# Altium footprint library PASSIVE_THD.PCBLIB: 84 footprints (part 1 of 6)
Each footprint in its own frame and in the unit in brackets; x right, y up, seen from the top. Pads: shape width x height; smd on the part's side, far side on the other; paste and mask are expansions set on the pad; w line width, h text height; cw(c..) or ccw(c..) is an arc to the next point about the centre after c.
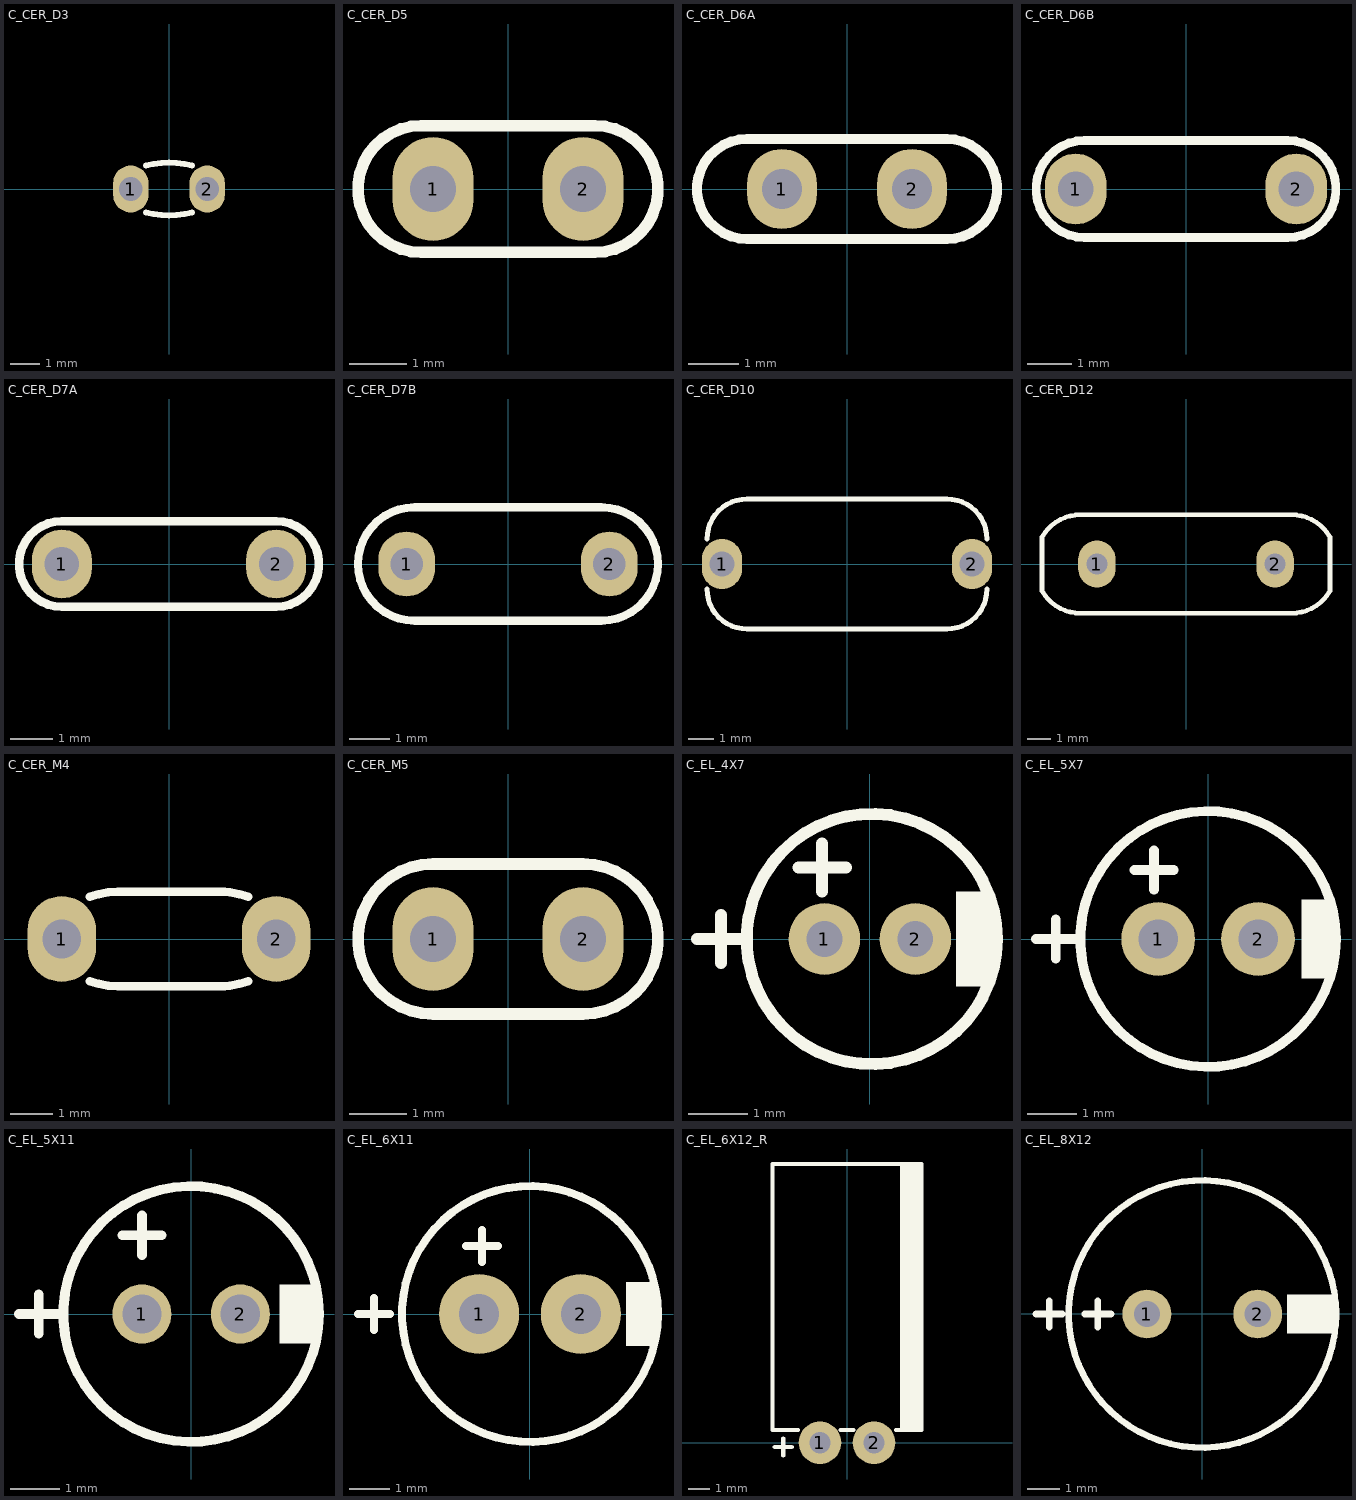
[diagram p0: the footprints below, top view; thin cyan lines are the x and y axes]

## C_CER_D3 [mm] "CAP, CER MULTILAYER, D:3.5mm, pitch: 2.54mm"
height 5.5
pads (2):
  oval 1.2x1.6 hole 0.8: 1(-1.3,0) 2(1.3,0)
TopOverlay:
  lines w0.2: -0.776,-0.798 ccw(c0,2.1) 0.776,-0.798 ; -0.776,0.798 cw(c0,-2.1) 0.776,0.798
3D body "User Library-Cer-Cap2 (3_5x1_5).step": height 4, standoff -2.5, extent -1.75,-0.75 1.75,0.751

## C_CER_D5 [mm] "CAP, CER, D:5mm, pitch: 2.5mm"
height 6.5
pads (2):
  oval 1.4x1.8 hole 0.8: 1(-1.3,0) 2(1.3,0)
TopOverlay:
  lines w0.2: -1.5,-1.1 cw(c-1.5,0) -1.5,1.1 1.5,1.1 cw(c1.5,0) 1.5,-1.1 -1.5,-1.1
3D body "Ceramic Capacitor 5x3_75mm.step": height 5.45, standoff -3.5, extent -2.458,-1 2.459,1

## C_CER_D6A [mm] "CAP, CER MULTILAYER, 5.8X1.7mm, pitch: 2.5mm"
height 6.5
pads (2):
  oval 1.4x1.6 hole 0.8 mask+0.075: 1(-1.3,0) 2(1.3,0)
TopOverlay:
  lines w0.2: -2,-1 cw(c-2,0) -2,1 2,1 cw(c2,0) 2,-1 -2,-1
3D body "Cap 100n.STEP": height 6.92, standoff -1, extent -2.918,-0.848 2.921,0.848

## C_CER_D6B [mm] "CAP, CER MULTILAYER, 6X2mm, pitch: 5mm"
height 6.5
pads (2):
  oval 1.4x1.6 hole 0.8 mask+0.075: 1(-2.5,0) 2(2.5,0)
TopOverlay:
  lines w0.2: -2.3,-1.1 cw(c-2.3,0) -2.3,1.1 2.3,1.1 cw(c2.3,0) 2.3,-1.1 -2.3,-1.1
3D body "User Library-Disc_CAP d6x3_5_5mm.step": height 8.1, standoff -2.02, extent -3,-1.05 3,1.05

## C_CER_D7A [mm] "CAP, CER MULTILAYER, 7.0X1.7mm, pitch: 5.0mm"
height 6.5
pads (2):
  oval 1.4x1.6 hole 0.8 mask+0.075: 1(-2.5,0) 2(2.5,0)
TopOverlay:
  lines w0.2: -2.5,-1 cw(c-2.5,0) -2.5,1 2.5,1 cw(c2.5,0) 2.5,-1 -2.5,-1
3D body "Cap 5mm Adasi.STEP": height 0, standoff -8.5, extent -3.499,-0.848 3.5,0.848

## C_CER_D7B [mm] "CAP, CER MULTILAYER, 7.0X2.6mm, pitch: 5.0mm"
height 6.5
pads (2):
  oval 1.4x1.6 hole 0.8 mask+0.075: 1(-2.5,0) 2(2.5,0)
TopOverlay:
  lines w0.2: -2.3,-1.4 cw(c-2.3,0) -2.3,1.4 2.3,1.4 cw(c2.3,0) 2.3,-1.4 -2.3,-1.4
3D body "User Library-CAPML200 (2_5x6_6).step": height 9.64, standoff -3.27, extent -3.537,-1.3 3.538,1.3

## C_CER_D10 [mm] "CAP, CER MULTILAYER, 12X4mm, pitch: 7.5mm"
height 5.5
pads (2):
  oval 1.6x2 hole 1: 1(-5,0) 2(5,0)
TopOverlay:
  lines w0.2: -5.6,-1 ccw(c-4,-1) -4,-2.6 4,-2.6 ccw(c4,-1) 5.6,-1 ; -5.6,1 cw(c-4,1) -4,2.6 4,2.6 cw(c4,1) 5.6,1
3D body "User Library-capacitor 10mm pitch.step": height 12.5, standoff -4, extent -5.5,-2.5 5.5,2.5

## C_CER_D12 [mm] "CAP, CER MULTILAYER, 12X4mm, pitch: 7.5mm"
height 5.5
pads (2):
  oval 1.6x2 hole 0.9: 1(-3.8,0) 2(3.8,0)
TopOverlay:
  lines w0.2: -6.145,-1.15 ccw(c-4.5,-0.2) -4.5,-2.1 4.5,-2.1 ccw(c4.5,-0.2) 6.145,-1.15 6.145,1.15 ccw(c4.5,0.2) 4.5,2.1 -4.5,2.1 ccw(c-4.5,0.2) -6.145,1.15 -6.145,-1.15
3D body: height 16, standoff 4, extent -6,-2 6,2
3D body: height 8, standoff -2, extent -4.097,-0.299 -3.5,0.3
3D body: height 8, standoff -2, extent 3.503,-0.299 4.1,0.3

## C_CER_M4 [mm] "CAP, CER MULTILAYER, 4.2X2.0mm, pitch: 5.0mm, TDK FK24"
height 5.5
pads (2):
  oval 1.6x2 hole 0.9: 1(-2.5,0) 2(2.5,0)
TopOverlay:
  lines w0.2: -1.85,-0.985 ccw(c-1.2,0.8) -1.2,-1.1 1.3,-1.1 ; -1.85,0.985 cw(c-1.2,-0.8) -1.2,1.1 1.3,1.1 ; 1.2,-1.1 ccw(c1.2,0.8) 1.85,-0.985 ; 1.2,1.1 cw(c1.2,-0.8) 1.85,0.985
3D body "TDK FK24 ceramic capacitor.STEP": height 5.47, standoff -2.54, extent -2.797,-1.003 2.798,1.003

## C_CER_M5 [mm] "CAP, CER MULTILAYER, 5.0X2.5mm, pitch: 2.5mm, RAD0.1"
height 6.5
pads (2):
  oval 1.4x1.8 hole 0.8: 1(-1.3,0) 2(1.3,0)
TopOverlay:
  lines w0.2: -1.3,-1.3 cw(c-1.3,0) -1.3,1.3 1.3,1.3 cw(c1.3,0) 1.3,-1.3 -1.3,-1.3
3D body "Capacitor ceramico 0_2in pitch.step": height 5.5, standoff -3.33, extent -2.75,-1.25 2.75,1.25

## C_EL_4X7 [mm] "Cap Elec, D4.0X7.0H pitch: 1.5mm"
height 7
pads (2):
  round 1.2 hole 0.6: 1(-0.762,0) 2(0.762,0)
TopOverlay:
  circle w0.2: c0.032,0 r2.1
  rectangle: 1.446,-0.8 2.046,0.8
  lines w0.2: -2.9,0 -2.1,0 ; -2.5,-0.4 -2.5,0.4 ; -1.2,1.2 -0.4,1.2 ; -0.8,0.8 -0.8,1.6
3D body "User Library-Cap electrolitic radial 4x7.STEP": height 1, standoff -7.5, extent -1.999,-1.997 1.999,2

## C_EL_5X7 [mm] "Cap Elec, D5.0X7.0H pitch: 2mm"
pads (2):
  round 1.5 hole 0.8: 1(-1.016,0) 2(1.016,0)
TopOverlay:
  circle w0.2: c0,0 r2.6
  rectangle: 1.9,-0.8 2.5,0.8
  lines w0.2: -3.5,0 -2.7,0 ; -3.1,-0.4 -3.1,0.4 ; -1.5,1.4 -0.7,1.4 ; -1.1,1 -1.1,1.8
3D body "User Library-Cap electro 5x7x2mm.step": height 7.33, standoff -3.47, extent -2.525,-2.525 2.526,2.526

## C_EL_5X11 [mm] "Cap Elec, D5.0X11.0H pitch: 2mm"
height 11
pads (2):
  round 1.2 / inner round 1.2 / far side oval 1.2x2 hole 0.8: 1(-1,0) 2(1,0)
TopOverlay:
  circle w0.2: c0,0 r2.6
  rectangle: 1.8,-0.6 2.6,0.6
  lines w0.2: -3.5,0 -2.7,0 ; -3.1,-0.4 -3.1,0.4 ; -1.4,1.6 -0.6,1.6 ; -1,1.2 -1,2
3D body "User Library-Cap electro 5x11x2mm.step": height 2.67, standoff -12.13, extent -2.525,-2.525 2.525,2.525

## C_EL_6X11 [mm] "Cap Elec, D6.3X11.0H pitch: 2.5mm"
height 11
pads (2):
  round 2 hole 1: 1(-1.27,0) 2(1.27,0)
TopOverlay:
  circle w0.2: c0,0 r3.2
  rectangle: 2.4,-0.8 3.184,0.8
  lines w0.2: -4.3,0 -3.5,0 ; -3.9,-0.4 -3.9,0.4 ; -1.6,1.7 -0.8,1.7 ; -1.2,1.3 -1.2,2.1
3D body "SW3dPS-Cap electro 6.3x11x2.5mm.STEP": height 2.51, standoff -12.03, extent -3.168,-3.175 3.175,3.176

## C_EL_6X12_R [mm] "Cap Elec, D6.3X12.0H pitch: 2.5mm"
height 11
pads (2):
  round 2 hole 1: 1(-1.27,0) 2(1.27,0)
TopOverlay:
  rectangle: 2.5,0.6 3.5,13.1
  lines w0.2: -3.4,-0.2 -2.6,-0.2 ; -3,-0.6 -3,0.2 ; -2.3,0.6 -3.5,0.6 -3.5,13.1 3.5,13.1 3.5,0.6 2.3,0.6 ; -0.3,0.6 0.3,0.6
3D body "CAPAE250P680X1220_FLAT1.STEP": height 6.77, standoff -1.78, extent -3.372,-0.249 3.371,12.952

## C_EL_8X12 [mm] "Cap Elec, D8.0X12.0H pitch: 3.5mm, RB.14/.26, RB.15/.32"
height 12
pads (2):
  round 1.5 hole 0.8: 1(-1.7,0) 2(1.7,0)
TopOverlay:
  circle w0.2: c0,0 r4.1
  rectangle: 2.6,-0.6 4,0.6
  lines w0.2: -5.1,0 -4.3,0 ; -4.7,-0.4 -4.7,0.4 ; -3.6,0 -2.8,0 ; -3.2,-0.4 -3.2,0.4
3D body "User Library-Cap electro 8x11_5x3_5mm.step": height 2.98, standoff -12.53, extent -4.017,-4.025 4.025,4.025